# Altium integrated library LEMO Unipole And Multipole Type Connectors.IntLib: 1566 symbols (part 4 of 13)
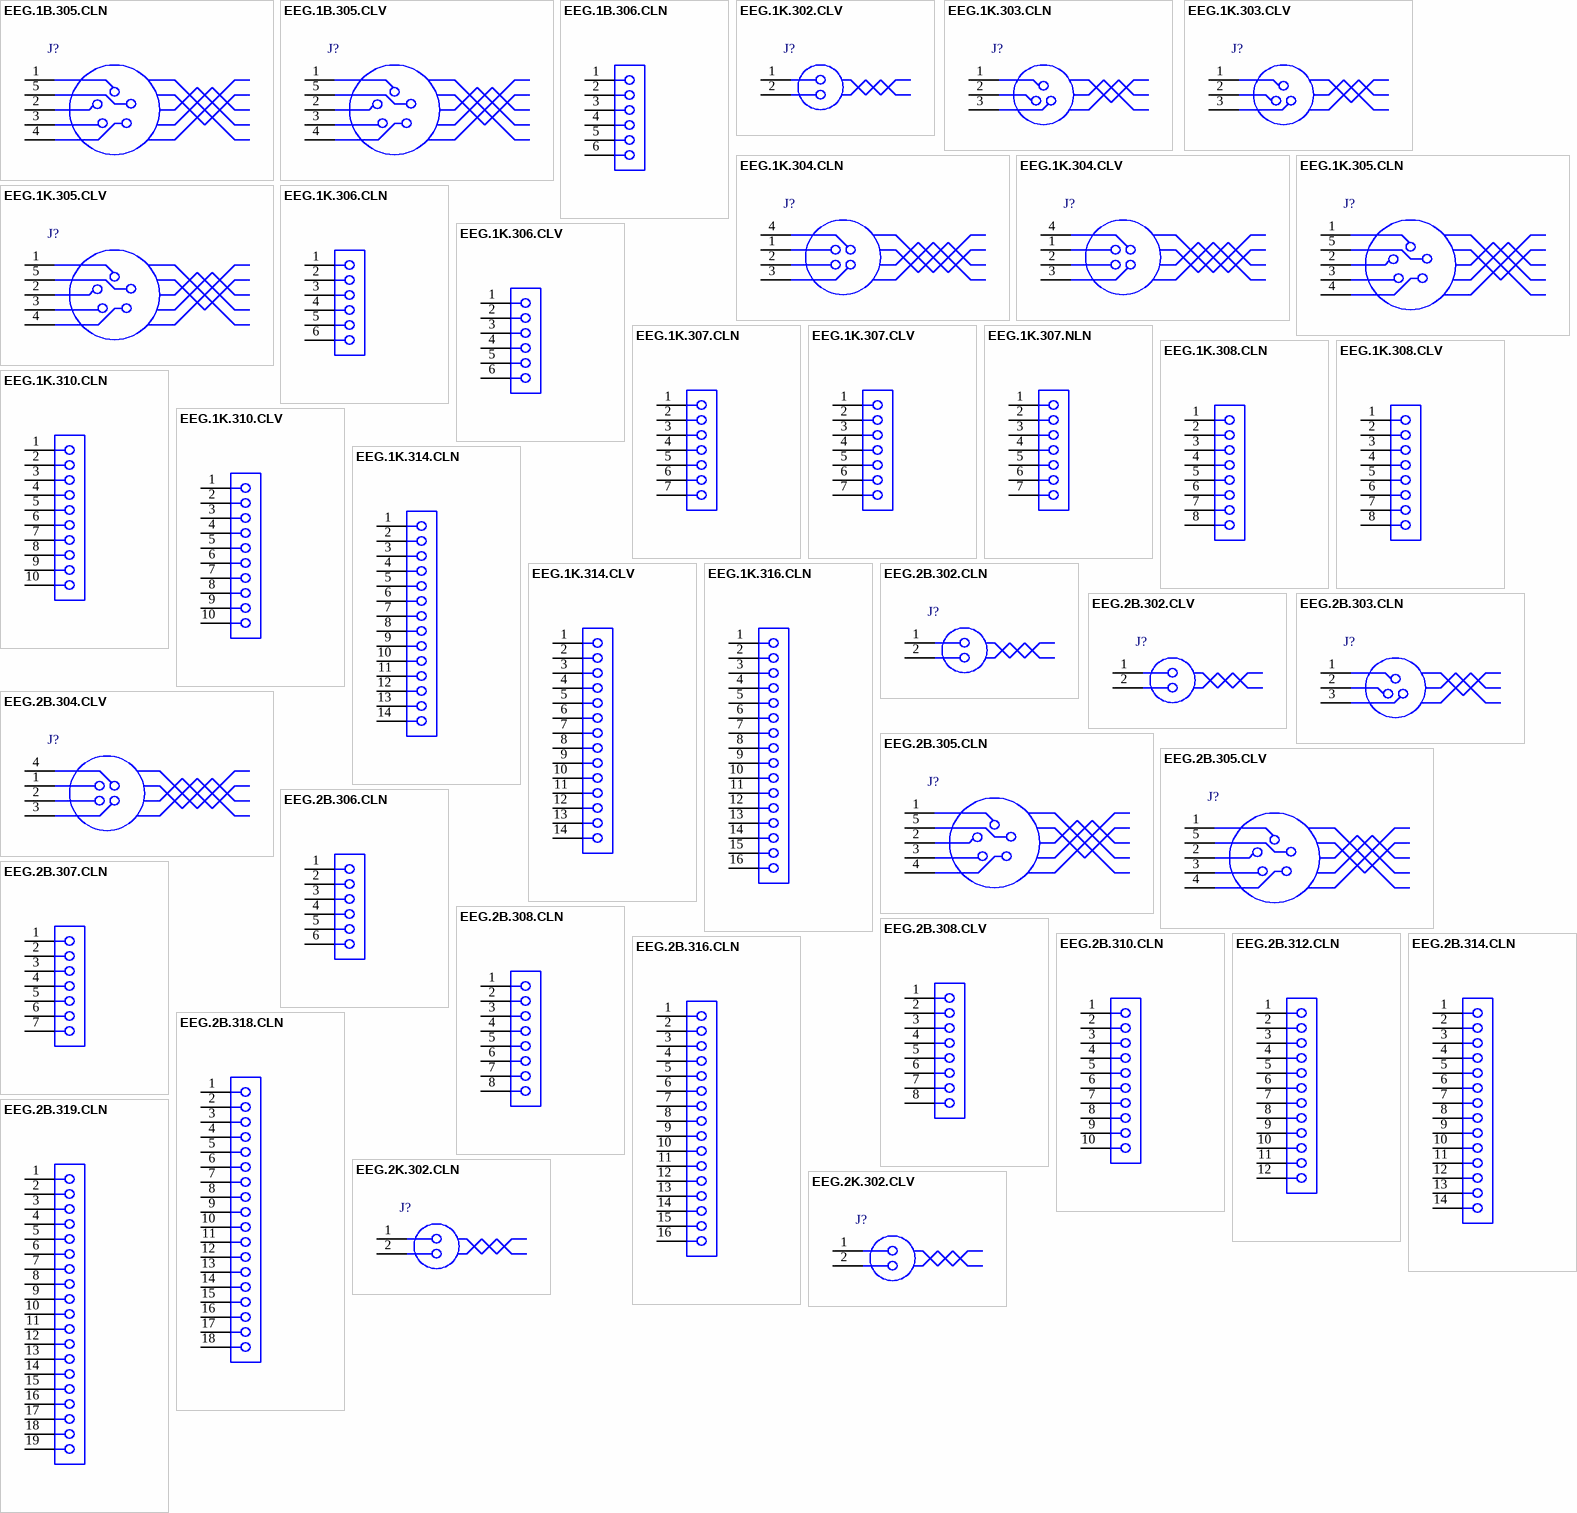
[diagram p46: symbols EEG.1B.305.CLN to EEG.2K.302.CLV]

## EEG.2B.303.CLN
designator J?
Fixed receptacle, nut fixing with straight contacts for printed circuit(back panel mounting), Key (G), 2B series, Multipole Type with 3 Contacts; Manufacturer: LEMO; PartNumber: EEG.2B.303.CLN; Number of contacts: 3; Contact Diameter: 1.6 mm; AWG: 16; Rated Current(A): 17; DatasheetVersion: Jun-14; PackageReference: EEG.2B.303.CLN; PackageDescription: Fixed receptacle, nut fixing with straight contacts for printed circuit(back panel mounting), Key(G) for Printed Circuit; Supplier 1: Mouser; Supplier Part Number 1: 736-EEG2B303CLN; Supplier 2: Digi-Key; Supplier Part Number 2: EEG.2B.303.CLN-ND; ComponentLink1Description: Manufacturer URL; ComponentLink1URL: http://www.lemo.com; ComponentLink2Description: Datasheet; ComponentLink2URL: http://intra.lemo.ch/catalog/ROW/UK_English/unipole_multipole.pdf
footprint EEG.2B.303.CLN (Socket, Female, Body 15mm dia. Height 24.6 mm, Through hole)
pins: 1, 2, 3

## EEG.2B.304.CLV
designator J?
Fixed receptacle, nut fixing with elbow contacts for printed circuit(back panel mounting), Key (G), 2B series, Multipole Type with 4 Contacts; Manufacturer: LEMO; PartNumber: EEG.2B.304.CLV; Number of contacts: 4; Contact Diameter: 1.3 mm; AWG: 20; Rated Current(A): 0; DatasheetVersion: Jun-14; PackageReference: EEG.2B.304.CLV; PackageDescription: Fixed receptacle, nut fixing with elbow contacts for printed circuit(back panel mounting), Key(G) for Printed Circuit; Supplier 1: Mouser; Supplier Part Number 1: 736-EEG2B304CLV; Supplier 2: Digi-Key; Supplier Part Number 2: EEG.2B.304.CLV-ND; ComponentLink1Description: Manufacturer URL; ComponentLink1URL: http://www.lemo.com; ComponentLink2Description: Datasheet; ComponentLink2URL: http://intra.lemo.ch/catalog/ROW/UK_English/unipole_multipole.pdf
footprint EEG.2B.304.CLV (Socket, Female, Body 15mm dia. Height 24.6 mm, Through hole)
pins: 1, 2, 3, 4

## EEG.2B.305.CLN
designator J?
Fixed receptacle, nut fixing with straight contacts for printed circuit(back panel mounting), Key (G), 2B series, Multipole Type with 5 Contacts; Manufacturer: LEMO; PartNumber: EEG.2B.305.CLN; Number of contacts: 5; Contact Diameter: 1.3 mm; AWG: 20; Rated Current(A): 14; DatasheetVersion: Jun-14; PackageReference: EEG.2B.305.CLN; PackageDescription: Fixed receptacle, nut fixing with straight contacts for printed circuit(back panel mounting), Key(G) for Printed Circuit; ComponentLink1Description: Manufacturer URL; ComponentLink1URL: http://www.lemo.com; ComponentLink2Description: Datasheet; ComponentLink2URL: http://intra.lemo.ch/catalog/ROW/UK_English/unipole_multipole.pdf
footprint EEG.2B.305.CLN (Socket, Female, Body 15mm dia. Height 24.6 mm, Through hole)
pins: 1, 2, 3, 4, 5

## EEG.2B.305.CLV
designator J?
Fixed receptacle, nut fixing with elbow contacts for printed circuit(back panel mounting), Key (G), 2B series, Multipole Type with 5 Contacts; Manufacturer: LEMO; PartNumber: EEG.2B.305.CLV; Number of contacts: 5; Contact Diameter: 1.3 mm; AWG: 20; Rated Current(A): 0; DatasheetVersion: Jun-14; PackageReference: EEG.2B.305.CLV; PackageDescription: Fixed receptacle, nut fixing with elbow contacts for printed circuit(back panel mounting), Key(G) for Printed Circuit; Supplier 1: Mouser; Supplier Part Number 1: 736-EEG2B305CLV; Supplier 2: Digi-Key; Supplier Part Number 2: EEG.2B.305.CLV-ND; ComponentLink1Description: Manufacturer URL; ComponentLink1URL: http://www.lemo.com; ComponentLink2Description: Datasheet; ComponentLink2URL: http://intra.lemo.ch/catalog/ROW/UK_English/unipole_multipole.pdf
footprint EEG.2B.305.CLV (Socket, Female, Body 15mm dia. Height 24.6 mm, Through hole)
pins: 1, 2, 3, 4, 5

## EEG.2B.306.CLN
designator J?
Fixed receptacle, nut fixing with straight contacts for printed circuit(back panel mounting), Key (G), 2B series, Multipole Type with 6 Contacts; Manufacturer: LEMO; PartNumber: EEG.2B.306.CLN; Number of contacts: 6; Contact Diameter: 1.3 mm; AWG: 20; Rated Current(A): 12; DatasheetVersion: Jun-14; PackageReference: EEG.2B.306.CLN; PackageDescription: Fixed receptacle, nut fixing with straight contacts for printed circuit(back panel mounting), Key(G) for Printed Circuit; Supplier 1: Mouser; Supplier Part Number 1: 736-EEG2B306CLN; Supplier 2: Digi-Key; Supplier Part Number 2: EEG.2B.306.CLN-ND; ComponentLink1Description: Manufacturer URL; ComponentLink1URL: http://www.lemo.com; ComponentLink2Description: Datasheet; ComponentLink2URL: http://intra.lemo.ch/catalog/ROW/UK_English/unipole_multipole.pdf
footprint EEG.2B.306.CLN (Socket, Female, Body 15mm dia. Height 24.6 mm, Through hole)
pins: 1, 2, 3, 4, 5, 6

## EEG.2B.307.CLN
designator J?
Fixed receptacle, nut fixing with straight contacts for printed circuit(back panel mounting), Key (G), 2B series, Multipole Type with 7 Contacts; Manufacturer: LEMO; PartNumber: EEG.2B.307.CLN; Number of contacts: 7; Contact Diameter: 1.3 mm; AWG: 20; Rated Current(A): 11; DatasheetVersion: Jun-14; PackageReference: EEG.2B.307.CLN; PackageDescription: Fixed receptacle, nut fixing with straight contacts for printed circuit(back panel mounting), Key(G) for Printed Circuit; Supplier 1: Mouser; Supplier Part Number 1: 736-EEG2B307CLN; Supplier 2: Digi-Key; Supplier Part Number 2: EEG.2B.307.CLN-ND; ComponentLink1Description: Manufacturer URL; ComponentLink1URL: http://www.lemo.com; ComponentLink2Description: Datasheet; ComponentLink2URL: http://intra.lemo.ch/catalog/ROW/UK_English/unipole_multipole.pdf
footprint EEG.2B.307.CLN (Socket, Female, Body 15mm dia. Height 24.6 mm, Through hole)
pins: 1, 2, 3, 4, 5, 6, 7

## EEG.2B.308.CLN
designator J?
Fixed receptacle, nut fixing with straight contacts for printed circuit(back panel mounting), Key (G), 2B series, Multipole Type with 8 Contacts; Manufacturer: LEMO; PartNumber: EEG.2B.308.CLN; Number of contacts: 8; Contact Diameter: 0.9 mm; AWG: 22; Rated Current(A): 10; DatasheetVersion: Jun-14; PackageReference: EEG.2B.308.CLN; PackageDescription: Fixed receptacle, nut fixing with straight contacts for printed circuit(back panel mounting), Key(G) for Printed Circuit; Supplier 1: Mouser; Supplier Part Number 1: 736-EEG2B308CLN; Supplier 2: Digi-Key; Supplier Part Number 2: EEG.2B.308.CLN-ND; ComponentLink1Description: Manufacturer URL; ComponentLink1URL: http://www.lemo.com; ComponentLink2Description: Datasheet; ComponentLink2URL: http://intra.lemo.ch/catalog/ROW/UK_English/unipole_multipole.pdf
footprint EEG.2B.308.CLN (Socket, Female, Body 15mm dia. Height 24.6 mm, Through hole)
pins: 1, 2, 3, 4, 5, 6, 7, 8

## EEG.2B.308.CLV
designator J?
Fixed receptacle, nut fixing with elbow contacts for printed circuit(back panel mounting), Key (G), 2B series, Multipole Type with 8 Contacts; Manufacturer: LEMO; PartNumber: EEG.2B.308.CLV; Number of contacts: 8; Contact Diameter: 0.9 mm; AWG: 22; Rated Current(A): 6; DatasheetVersion: Jun-14; PackageReference: EEG.2B.308.CLV; PackageDescription: Fixed receptacle, nut fixing with elbow contacts for printed circuit(back panel mounting), Key(G) for Printed Circuit; Supplier 1: Mouser; Supplier Part Number 1: 736-EEG2B308CLV; Supplier 2: Digi-Key; Supplier Part Number 2: EEG.2B.308.CLV-ND; ComponentLink1Description: Manufacturer URL; ComponentLink1URL: http://www.lemo.com; ComponentLink2Description: Datasheet; ComponentLink2URL: http://intra.lemo.ch/catalog/ROW/UK_English/unipole_multipole.pdf
footprint EEG.2B.308.CLV (Socket, Female, Body 15mm dia. Height 24.6 mm, Through hole)
pins: 1, 2, 3, 4, 5, 6, 7, 8

## EEG.2B.310.CLN
designator J?
Fixed receptacle, nut fixing with straight contacts for printed circuit(back panel mounting), Key (G), 2B series, Multipole Type with 10 Contacts; Manufacturer: LEMO; PartNumber: EEG.2B.310.CLN; Number of contacts: 10; Contact Diameter: 0.9 mm; AWG: 22; Rated Current(A): 8; DatasheetVersion: Jun-14; PackageReference: EEG.2B.310.CLN; PackageDescription: Fixed receptacle, nut fixing with straight contacts for printed circuit(back panel mounting), Key(G) for Printed Circuit; Supplier 1: Mouser; Supplier Part Number 1: 736-EEG2B310CLN; Supplier 2: Digi-Key; Supplier Part Number 2: EEG.2B.310.CLN-ND; ComponentLink1Description: Manufacturer URL; ComponentLink1URL: http://www.lemo.com; ComponentLink2Description: Datasheet; ComponentLink2URL: http://intra.lemo.ch/catalog/ROW/UK_English/unipole_multipole.pdf
footprint EEG.2B.310.CLN (Socket, Female, Body 15mm dia. Height 24.6 mm, Through hole)
pins: 1, 2, 3, 4, 5, 6, 7, 8, 9, 10

## EEG.2B.312.CLN
designator J?
Fixed receptacle, nut fixing with straight contacts for printed circuit(back panel mounting), Key (G), 2B series, Multipole Type with 12 Contacts; Manufacturer: LEMO; PartNumber: EEG.2B.312.CLN; Number of contacts: 12; Contact Diameter: 0.7 mm; AWG: 24; Rated Current(A): 7; DatasheetVersion: Jun-14; PackageReference: EEG.2B.312.CLN; PackageDescription: Fixed receptacle, nut fixing with straight contacts for printed circuit(back panel mounting), Key(G) for Printed Circuit; Supplier 1: Mouser; Supplier Part Number 1: 736-EEG2B312CLN; Supplier 2: Digi-Key; Supplier Part Number 2: EEG.2B.312.CLN-ND; ComponentLink1Description: Manufacturer URL; ComponentLink1URL: http://www.lemo.com; ComponentLink2Description: Datasheet; ComponentLink2URL: http://intra.lemo.ch/catalog/ROW/UK_English/unipole_multipole.pdf
footprint EEG.2B.312.CLN (Socket, Female, Body 15mm dia. Height 24.6 mm, Through hole)
pins: 1, 2, 3, 4, 5, 6, 7, 8, 9, 10, 11, 12

## EEG.2B.314.CLN
designator J?
Fixed receptacle, nut fixing with straight contacts for printed circuit(back panel mounting), Key (G), 2B series, Multipole Type with 14 Contacts; Manufacturer: LEMO; PartNumber: EEG.2B.314.CLN; Number of contacts: 14; Contact Diameter: 0.7 mm; AWG: 24; Rated Current(A): 6.5; DatasheetVersion: Jun-14; PackageReference: EEG.2B.314.CLN; PackageDescription: Fixed receptacle, nut fixing with straight contacts for printed circuit(back panel mounting), Key(G) for Printed Circuit; Supplier 1: Mouser; Supplier Part Number 1: 736-EEG2B314CLN; Supplier 2: Digi-Key; Supplier Part Number 2: EEG.2B.314.CLN-ND; ComponentLink1Description: Manufacturer URL; ComponentLink1URL: http://www.lemo.com; ComponentLink2Description: Datasheet; ComponentLink2URL: http://intra.lemo.ch/catalog/ROW/UK_English/unipole_multipole.pdf
footprint EEG.2B.314.CLN (Socket, Female, Body 15mm dia. Height 24.6 mm, Through hole)
pins: 1, 2, 3, 4, 5, 6, 7, 8, 9, 10, 11, 12, 13, 14

## EEG.2B.316.CLN
designator J?
Fixed receptacle, nut fixing with straight contacts for printed circuit(back panel mounting), Key (G), 2B series, Multipole Type with 16 Contacts; Manufacturer: LEMO; PartNumber: EEG.2B.316.CLN; Number of contacts: 16; Contact Diameter: 0.7 mm; AWG: 24; Rated Current(A): 6; DatasheetVersion: Jun-14; PackageReference: EEG.2B.316.CLN; PackageDescription: Fixed receptacle, nut fixing with straight contacts for printed circuit(back panel mounting), Key(G) for Printed Circuit; Supplier 1: Mouser; Supplier Part Number 1: 736-EEG2B316CLN; Supplier 2: Digi-Key; Supplier Part Number 2: EEG.2B.316.CLN-ND; ComponentLink1Description: Manufacturer URL; ComponentLink1URL: http://www.lemo.com; ComponentLink2Description: Datasheet; ComponentLink2URL: http://intra.lemo.ch/catalog/ROW/UK_English/unipole_multipole.pdf
footprint EEG.2B.316.CLN (Socket, Female, Body 15mm dia. Height 24.6 mm, Through hole)
pins: 1, 2, 3, 4, 5, 6, 7, 8, 9, 10, 11, 12, 13, 14, 15, 16

## EEG.2B.318.CLN
designator J?
Fixed receptacle, nut fixing with straight contacts for printed circuit(back panel mounting), Key (G), 2B series, Multipole Type with 18 Contacts; Manufacturer: LEMO; PartNumber: EEG.2B.318.CLN; Number of contacts: 18; Contact Diameter: 0.7 mm; AWG: 24; Rated Current(A): 5.5; DatasheetVersion: Jun-14; PackageReference: EEG.2B.318.CLN; PackageDescription: Fixed receptacle, nut fixing with straight contacts for printed circuit(back panel mounting), Key(G) for Printed Circuit; Supplier 1: Mouser; Supplier Part Number 1: 736-EEG2B318CLN; Supplier 2: Digi-Key; Supplier Part Number 2: EEG.2B.318.CLN-ND; ComponentLink1Description: Manufacturer URL; ComponentLink1URL: http://www.lemo.com; ComponentLink2Description: Datasheet; ComponentLink2URL: http://intra.lemo.ch/catalog/ROW/UK_English/unipole_multipole.pdf
footprint EEG.2B.318.CLN (Socket, Female, Body 15mm dia. Height 24.6 mm, Through hole)
pins: 1, 2, 3, 4, 5, 6, 7, 8, 9, 10, 11, 12, 13, 14, 15, 16, 17, 18

## EEG.2B.319.CLN
designator J?
Fixed receptacle, nut fixing with straight contacts for printed circuit(back panel mounting), Key (G), 2B series, Multipole Type with 19 Contacts; Manufacturer: LEMO; PartNumber: EEG.2B.319.CLN; Number of contacts: 19; Contact Diameter: 0.7 mm; AWG: 24; Rated Current(A): 5; DatasheetVersion: Jun-14; PackageReference: EEG.2B.319.CLN; PackageDescription: Fixed receptacle, nut fixing with straight contacts for printed circuit(back panel mounting), Key(G) for Printed Circuit; Supplier 1: Mouser; Supplier Part Number 1: 736-EEG2B319CLN; Supplier 2: Digi-Key; Supplier Part Number 2: EEG.2B.319.CLN-ND; ComponentLink1Description: Manufacturer URL; ComponentLink1URL: http://www.lemo.com; ComponentLink2Description: Datasheet; ComponentLink2URL: http://intra.lemo.ch/catalog/ROW/UK_English/unipole_multipole.pdf
footprint EEG.2B.319.CLN (Socket, Female, Body 15mm dia. Height 24.6 mm, Through hole)
pins: 1, 2, 3, 4, 5, 6, 7, 8, 9, 10, 11, 12, 13, 14, 15, 16, 17, 18, 19

## EEG.2K.302.CLN
designator J?
Fixed receptacle, nut fixing, with straight contacts for printed circuit (back panel mounting), Key (G), 2K series, Multipole Type with 2 Contacts; Manufacturer: LEMO; PartNumber: EEG.2K.302.CLN; Number of contacts: 2; Contact Diameter: 2 mm; AWG: 14; Rated Current(A): 30; DatasheetVersion: Jun-14; PackageReference: EEG.2K.302.CLN; PackageDescription: Fixed receptacle, nut fixing, with straight contacts for printed circuit (back panel mounting), Key(G) for Printed Circuit; ComponentLink1Description: Manufacturer URL; ComponentLink1URL: http://www.lemo.com; ComponentLink2Description: Datasheet; ComponentLink2URL: http://intra.lemo.ch/catalog/ROW/UK_English/unipole_multipole.pdf
footprint EEG.2K.302.CLN (Socket, Female, Body 20mm dia. Height 25.8 mm, Through hole)
pins: 1, 2

## EEG.2K.302.CLV
designator J?
Fixed receptacle, nut fixing, with elbow contacts for printed circuit (back panel mounting), Key (G), 2K series, Multipole Type with 2 Contacts; Manufacturer: LEMO; PartNumber: EEG.2K.302.CLV; Number of contacts: 2; Contact Diameter: 2 mm; AWG: 14; Rated Current(A): 12; DatasheetVersion: Jun-14; PackageReference: EEG.2K.302.CLV; PackageDescription: Fixed receptacle, nut fixing, with elbow contacts for printed circuit (back panel mounting), Key(G) for Printed Circuit; Supplier 1: Mouser; Supplier Part Number 1: 736-EEG2K302CLV; Supplier 2: Digi-Key; Supplier Part Number 2: EEG.2K.302.CLV-ND; ComponentLink1Description: Manufacturer URL; ComponentLink1URL: http://www.lemo.com; ComponentLink2Description: Datasheet; ComponentLink2URL: http://intra.lemo.ch/catalog/ROW/UK_English/unipole_multipole.pdf
footprint EEG.2K.302.CLV (Socket, Female, Body 20mm dia. Height 26.6 mm, Through hole)
pins: 1, 2

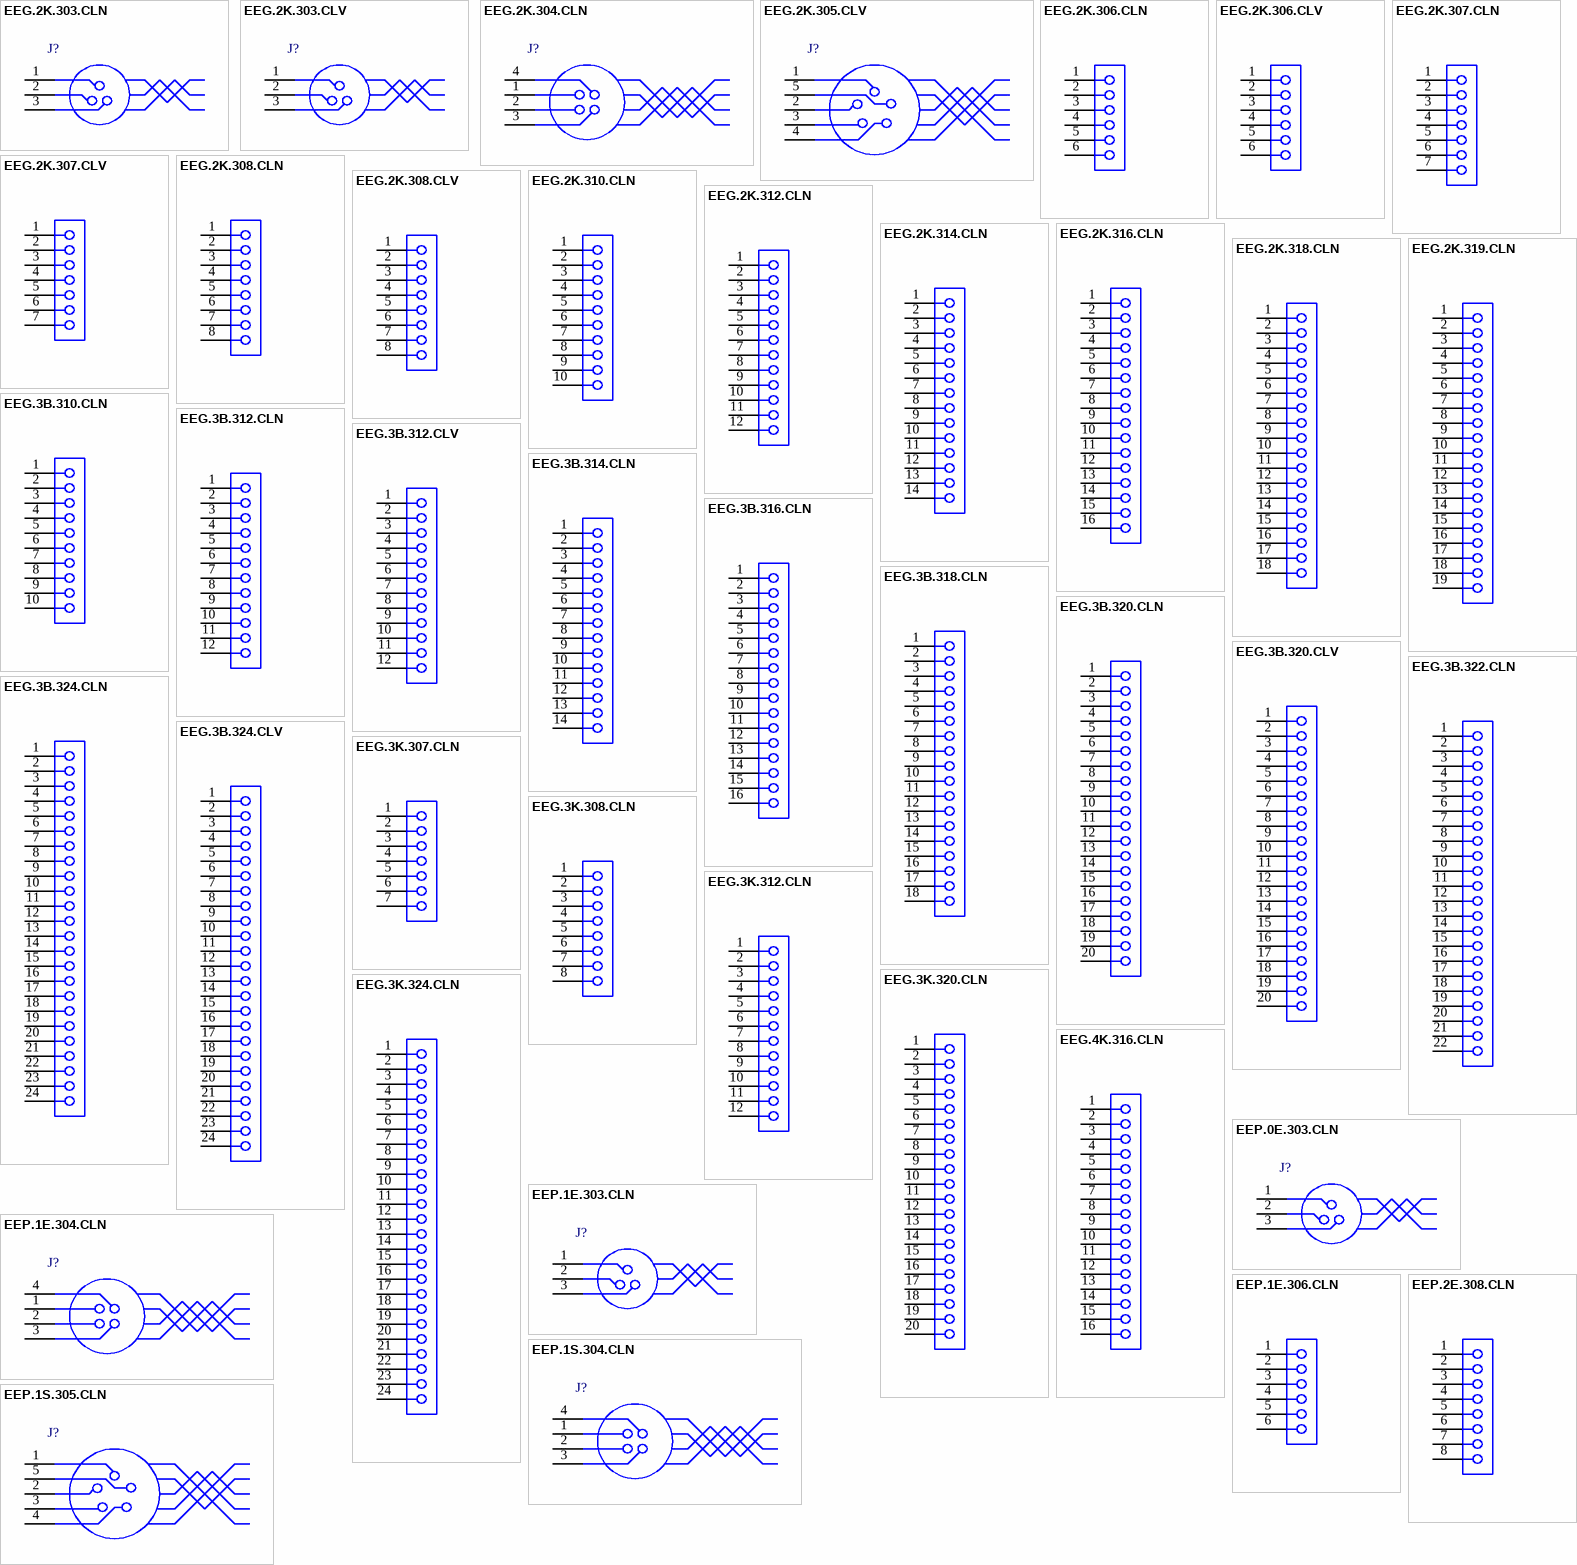
[diagram p11: symbols EEG.2K.303.CLN to EEP.2E.308.CLN]

## EEG.2K.303.CLN
designator J?
Fixed receptacle, nut fixing, with straight contacts for printed circuit (back panel mounting), Key (G), 2K series, Multipole Type with 3 Contacts; Manufacturer: LEMO; PartNumber: EEG.2K.303.CLN; Number of contacts: 3; Contact Diameter: 1.6 mm; AWG: 16; Rated Current(A): 17; DatasheetVersion: Jun-14; PackageReference: EEG.2K.303.CLN; PackageDescription: Fixed receptacle, nut fixing, with straight contacts for printed circuit (back panel mounting), Key(G) for Printed Circuit; ComponentLink1Description: Manufacturer URL; ComponentLink1URL: http://www.lemo.com; ComponentLink2Description: Datasheet; ComponentLink2URL: http://intra.lemo.ch/catalog/ROW/UK_English/unipole_multipole.pdf
footprint EEG.2K.303.CLN (Socket, Female, Body 20mm dia. Height 25.8 mm, Through hole)
pins: 1, 2, 3

## EEG.2K.303.CLV
designator J?
Fixed receptacle, nut fixing, with elbow contacts for printed circuit (back panel mounting), Key (G), 2K series, Multipole Type with 3 Contacts; Manufacturer: LEMO; PartNumber: EEG.2K.303.CLV; Number of contacts: 3; Contact Diameter: 1.6 mm; AWG: 16; Rated Current(A): 12; DatasheetVersion: Jun-14; PackageReference: EEG.2K.303.CLV; PackageDescription: Fixed receptacle, nut fixing, with elbow contacts for printed circuit (back panel mounting), Key(G) for Printed Circuit; Supplier 1: Mouser; Supplier Part Number 1: 736-EEG2K303CLV; Supplier 2: Digi-Key; Supplier Part Number 2: EEG.2K.303.CLV-ND; ComponentLink1Description: Manufacturer URL; ComponentLink1URL: http://www.lemo.com; ComponentLink2Description: Datasheet; ComponentLink2URL: http://intra.lemo.ch/catalog/ROW/UK_English/unipole_multipole.pdf
footprint EEG.2K.303.CLV (Socket, Female, Body 20mm dia. Height 26.6 mm, Through hole)
pins: 1, 2, 3

## EEG.2K.304.CLN
designator J?
Fixed receptacle, nut fixing, with straight contacts for printed circuit (back panel mounting), Key (G), 2K series, Multipole Type with 4 Contacts; Manufacturer: LEMO; PartNumber: EEG.2K.304.CLN; Number of contacts: 4; Contact Diameter: 1.3 mm; AWG: 20; Rated Current(A): 15; DatasheetVersion: Jun-14; PackageReference: EEG.2K.304.CLN; PackageDescription: Fixed receptacle, nut fixing, with straight contacts for printed circuit (back panel mounting), Key(G) for Printed Circuit; ComponentLink1Description: Manufacturer URL; ComponentLink1URL: http://www.lemo.com; ComponentLink2Description: Datasheet; ComponentLink2URL: http://intra.lemo.ch/catalog/ROW/UK_English/unipole_multipole.pdf
footprint EEG.2K.304.CLN (Socket, Female, Body 20mm dia. Height 25.8 mm, Through hole)
pins: 1, 2, 3, 4

## EEG.2K.305.CLV
designator J?
Fixed receptacle, nut fixing, with elbow contacts for printed circuit (back panel mounting), Key (G), 2K series, Multipole Type with 5 Contacts; Manufacturer: LEMO; PartNumber: EEG.2K.305.CLV; Number of contacts: 5; Contact Diameter: 1.3 mm; AWG: 20; Rated Current(A): 0; DatasheetVersion: Jun-14; PackageReference: EEG.2K.305.CLV; PackageDescription: Fixed receptacle, nut fixing, with elbow contacts for printed circuit (back panel mounting), Key(G) for Printed Circuit; ComponentLink1Description: Manufacturer URL; ComponentLink1URL: http://www.lemo.com; ComponentLink2Description: Datasheet; ComponentLink2URL: http://intra.lemo.ch/catalog/ROW/UK_English/unipole_multipole.pdf
footprint EEG.2K.305.CLV (Socket, Female, Body 20mm dia. Height 26.6 mm, Through hole)
pins: 1, 2, 3, 4, 5
